# Altium footprint library Reflow3D1411sep.PcbLib: 657 footprints (part 29 of 42)
Each footprint in its own frame and in the unit in brackets; x right, y up, seen from the top. Pads: shape width x height; smd on the part's side, far side on the other; paste and mask are expansions set on the pad; w line width, h text height; cw(c..) or ccw(c..) is an arc to the next point about the centre after c.
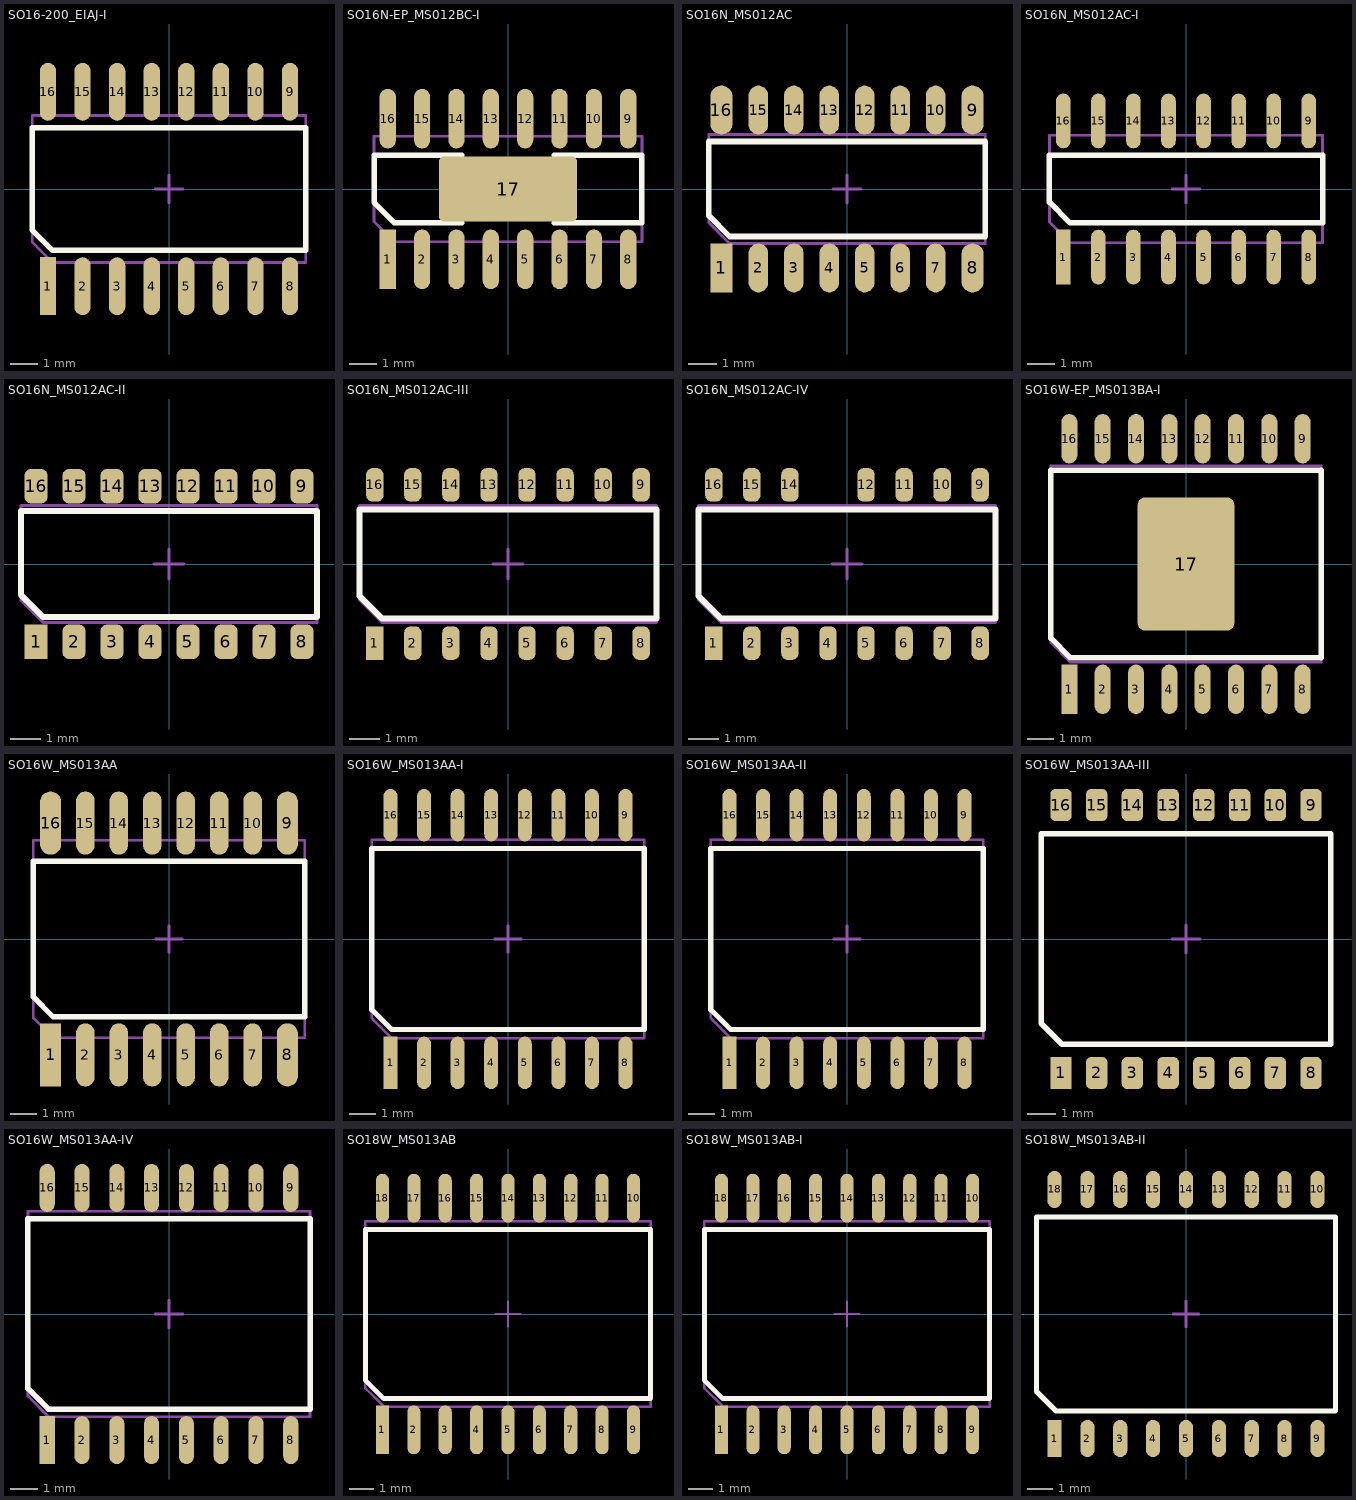
[diagram p28: the footprints below, top view; thin cyan lines are the x and y axes]

## SO16-200_EIAJ-I [mm] "www.fairchildsemi.com, M16D.pdf; www.intersil.com, M16.2-S.pdf"
height 1.85
pads (16):
  rect 0.6x2.13 smd mask+0.075: 1(-4.445,-3.57)
  oval 0.6x2.13 smd mask+0.075: 2(-3.175,-3.57) 3(-1.905,-3.57) 4(-0.635,-3.57) 5(0.635,-3.57) 6(1.905,-3.57) 7(3.175,-3.57) 8(4.445,-3.57) 9(4.445,3.57) 10(3.175,3.57) 11(1.905,3.57) 12(0.635,3.57) 13(-0.635,3.57) 14(-1.905,3.57) 15(-3.175,3.57) 16(-4.445,3.57)
Top Overlay:
  lines w0.2: -5.025,-1.5 -5.025,2.25 5.025,2.25 5.025,-2.25 -4.275,-2.25 -5.025,-1.5
Mechanical 13:
  lines w0.1: -5.025,-1.95 -5.025,2.7 5.025,2.7 5.025,-2.7 -4.275,-2.7 -5.025,-1.95
Mechanical 15:
  lines w0.1: -0.5,0 0.5,0 ; 0,-0.5 0,0.5
3D body: height 2, standoff 0, extent -5.15,-2.8 5.15,2.8

## SO16N-EP_MS012BC-I [mm] "www.semtech.com, sc4624.pdf"
height 1.55
pads (17):
  rect 0.6x2.2 smd mask+0.075: 1(-4.445,-2.6)
  oval 0.6x2.2 smd mask+0.075: 2(-3.175,-2.6) 4(-0.635,-2.6) 5(0.635,-2.6) 6(1.905,-2.6) 7(3.175,-2.6) 8(4.445,-2.6) 9(4.445,2.6) 10(3.175,2.6) 11(1.905,2.6) 12(0.635,2.6) 13(-0.635,2.6) 15(-3.175,2.6) 16(-4.445,2.6)
  oval 0.6x2.2 smd paste+0 mask+0.075: 3(-1.905,-2.6) 14(-1.905,2.6)
  rrect15% 5.1x2.4 smd paste-25.4 mask-25.4: 17(0,0)
Top Overlay:
  lines w0.2: -1.7,-1.25 -4.2,-1.25 -4.95,-0.5 -4.95,1.25 -1.7,1.25 ; 1.7,-1.25 4.95,-1.25 4.95,1.25 1.7,1.25
Top Paste:
  region: -1.4,1.15 1.4,1.15 1.4,-1.15 -1.4,-1.15
Top Solder:
  region: -1.45,1.275 -1.45,-1.275 1.45,-1.275 1.45,1.275
Mechanical 13:
  lines w0.1: -1.335,-0.58 -1.335,-1.08 -0.835,-1.08 ; -1.335,0.58 -1.335,1.08 -0.835,1.08 ; 0.835,-1.08 1.335,-1.08 1.335,-0.58 ; 0.835,1.08 1.335,1.08 1.335,0.58 ; -4.95,-1.2 -4.95,1.95 4.95,1.95 4.95,-1.95 -4.2,-1.95 -4.95,-1.2
Mechanical 15:
  lines w0.1: -0.5,0 0.5,0 ; 0,-0.5 0,0.5
3D body: height 1.75, standoff 0, extent -5,-2 5,2

## SO16N_MS012AC [mm] "www.nxp.com, SOT109-1.pdf, SOT109-1_fp_reflow.pdf"
height 1.55
pads (16):
  rect 0.8x1.75 smd mask+0.075: 1(-4.495,-2.825)
  oval 0.7x1.75 smd mask+0.075: 2(-3.175,-2.825) 3(-1.905,-2.825) 4(-0.635,-2.825) 5(0.635,-2.825) 6(1.905,-2.825) 7(3.175,-2.825) 10(3.175,2.825) 11(1.905,2.825) 12(0.635,2.825) 13(-0.635,2.825) 14(-1.905,2.825) 15(-3.175,2.825)
  oval 0.8x1.75 smd mask+0.075: 8(4.495,-2.825) 9(4.495,2.825) 16(-4.495,2.825)
Top Overlay:
  lines w0.2: -4.95,-0.95 -4.95,1.7 4.95,1.7 4.95,-1.7 -4.2,-1.7 -4.95,-0.95
Mechanical 13:
  lines w0.1: -4.95,-1.2 -4.2,-1.95 4.95,-1.95 4.95,1.95 -4.95,1.95 -4.95,-1.2
Mechanical 15:
  lines w0.1: -0.5,0 0.5,0 ; 0,-0.5 0,0.5
3D body: height 1.75, standoff 0, extent -5,-2 5,2

## SO16N_MS012AC-I [mm] "www.maxim-ic.com, 21-0041.PDF, 90-0097.PDF; www.jedec.org, MS-012F.pdf"
height 1.55
pads (16):
  rect 0.53x1.98 smd mask+0.075: 1(-4.445,-2.465)
  oval 0.53x1.98 smd mask+0.075: 2(-3.175,-2.465) 4(-0.635,-2.465) 5(0.635,-2.465) 6(1.905,-2.465) 7(3.175,-2.465) 8(4.445,-2.465) 9(4.445,2.465) 10(3.175,2.465) 11(1.905,2.465) 12(0.635,2.465) 13(-0.635,2.465) 15(-3.175,2.465) 16(-4.445,2.465)
  oval 0.53x1.98 smd paste+0 mask+0.075: 3(-1.905,-2.465) 14(-1.905,2.465)
Top Overlay:
  lines w0.2: -4.95,-0.475 -4.95,1.225 4.95,1.225 4.95,-1.225 -4.2,-1.225 -4.95,-0.475
Mechanical 13:
  lines w0.1: -4.95,-1.2 -4.95,1.95 4.95,1.95 4.95,-1.95 -4.2,-1.95 -4.95,-1.2
Mechanical 15:
  lines w0.1: -0.5,0 0.5,0 ; 0,-0.5 0,0.5
3D body: height 1.75, standoff 0, extent -5,-2 5,2

## SO16N_MS012AC-II [mm] "www.linear.com, SO_16_05-08-1610.pdf"
height 1.55
pads (16):
  rect 0.76x1.14 smd mask+0.075: 1(-4.445,-2.6)
  rrect50% 0.76x1.14 smd mask+0.075: 2(-3.175,-2.6) 4(-0.635,-2.6) 5(0.635,-2.6) 6(1.905,-2.6) 7(3.175,-2.6) 8(4.445,-2.6) 9(4.445,2.6) 10(3.175,2.6) 11(1.905,2.6) 13(-0.635,2.6) 14(-1.905,2.6) 15(-3.175,2.6) 16(-4.445,2.6)
  rrect50% 0.76x1.14 smd paste+0 mask+0.075: 3(-1.905,-2.6) 12(0.635,2.6)
Top Overlay:
  lines w0.2: -4.955,-1.025 -4.955,1.775 4.955,1.775 4.955,-1.775 -4.205,-1.775 -4.955,-1.025
Mechanical 13:
  lines w0.1: -4.955,-1.2 -4.205,-1.95 4.955,-1.95 4.955,1.95 -4.955,1.95 -4.955,-1.2
Mechanical 15:
  lines w0.1: -0.5,0 0.5,0 ; 0,-0.5 0,0.5
3D body: height 1.75, standoff 0, extent -5.005,-1.995 5.005,1.995

## SO16N_MS012AC-III [mm] "www.onsemi.com, 751B-05.PDF"
height 1.55
pads (16):
  rect 0.58x1.12 smd mask+0.075: 1(-4.445,-2.64)
  rrect75% 0.58x1.12 smd mask+0.075: 2(-3.175,-2.64) 4(-0.635,-2.64) 5(0.635,-2.64) 6(1.905,-2.64) 7(3.175,-2.64) 8(4.445,-2.64) 9(4.445,2.64) 10(3.175,2.64) 11(1.905,2.64) 12(0.635,2.64) 13(-0.635,2.64) 15(-3.175,2.64) 16(-4.445,2.64)
  rrect75% 0.58x1.12 smd paste+0 mask+0.075: 3(-1.905,-2.64) 14(-1.905,2.64)
Top Overlay:
  lines w0.2: -4.95,-1.075 -4.2,-1.825 4.95,-1.825 4.95,1.825 -4.95,1.825 -4.95,-1.075
Mechanical 13:
  lines w0.1: -4.95,-1.2 -4.2,-1.95 4.95,-1.95 4.95,1.95 -4.95,1.95 -4.95,-1.2
Mechanical 15:
  lines w0.1: -0.5,0 0.5,0 ; 0,-0.5 0,0.5
3D body: height 1.75, standoff 0, extent -5,-2 5,2

## SO16N_MS012AC-IV [mm] "www.onsemi.com, 751AM.PDF"
height 1.55
pads (15):
  rect 0.58x1.12 smd mask+0.075: 1(-4.445,-2.64)
  rrect75% 0.58x1.12 smd mask+0.075: 2(-3.175,-2.64) 4(-0.635,-2.64) 5(0.635,-2.64) 6(1.905,-2.64) 7(3.175,-2.64) 8(4.445,-2.64) 9(4.445,2.64) 10(3.175,2.64) 11(1.905,2.64) 12(0.635,2.64) 15(-3.175,2.64) 16(-4.445,2.64)
  rrect75% 0.58x1.12 smd paste+0 mask+0.075: 3(-1.905,-2.64) 14(-1.905,2.64)
Top Overlay:
  lines w0.2: -4.95,-1.075 -4.95,1.825 4.95,1.825 4.95,-1.825 -4.2,-1.825 -4.95,-1.075
Mechanical 13:
  lines w0.1: -4.95,-1.2 -4.95,1.95 4.95,1.95 4.95,-1.95 -4.2,-1.95 -4.95,-1.2
Mechanical 15:
  lines w0.1: -0.5,0 0.5,0 ; 0,-0.5 0,0.5
3D body: height 1.75, standoff 0, extent -5,-2 5,2

## SO16W-EP_MS013BA-I [mm] "www.onsemi.com, 751AG.PDF"
height 2.5
pads (17):
  rect 0.61x1.88 smd mask+0.075: 1(-4.445,-4.775)
  oval 0.61x1.88 smd mask+0.075: 2(-3.175,-4.775) 3(-1.905,-4.775) 4(-0.635,-4.775) 5(0.635,-4.775) 6(1.905,-4.775) 7(3.175,-4.775) 8(4.445,-4.775) 9(4.445,4.775) 10(3.175,4.775) 11(1.905,4.775) 12(0.635,4.775) 13(-0.635,4.775) 14(-1.905,4.775) 15(-3.175,4.775) 16(-4.445,4.775)
  rrect15% 3.68x5.08 smd mask+0.075: 17(0,0)
Top Overlay:
  lines w0.2: -5.15,-2.825 -4.4,-3.575 5.15,-3.575 5.15,3.575 -5.15,3.575 -5.15,-2.825
Mechanical 13:
  lines w0.1: -1.705,-1.84 -1.705,-2.34 -1.205,-2.34 ; -1.705,1.84 -1.705,2.34 -1.205,2.34 ; 1.205,-2.34 1.705,-2.34 1.705,-1.84 ; 1.205,2.34 1.705,2.34 1.705,1.84 ; -5.15,-3 -4.4,-3.75 5.15,-3.75 5.15,3.75 -5.15,3.75 -5.15,-3
Mechanical 15:
  lines w0.1: -0.5,0 0.5,0 ; 0,-0.5 0,0.5
3D body: height 2.65, standoff 0, extent -5.225,-3.8 5.225,3.8

## SO16W_MS013AA [mm] "www.nxp.com, sot162-1_po.pdf, SOT162-1_fp_reflow.pdf"
height 2.5
pads (16):
  rect 0.8x2.4 smd mask+0.075: 1(-4.495,-4.4)
  oval 0.7x2.4 smd mask+0.075: 2(-3.175,-4.4) 3(-1.905,-4.4) 4(-0.635,-4.4) 5(0.635,-4.4) 6(1.905,-4.4) 7(3.175,-4.4) 10(3.175,4.4) 11(1.905,4.4) 12(0.635,4.4) 13(-0.635,4.4) 14(-1.905,4.4) 15(-3.175,4.4)
  oval 0.8x2.4 smd mask+0.075: 8(4.495,-4.4) 9(4.495,4.4) 16(-4.495,4.4)
Top Overlay:
  lines w0.2: -5.15,-2.2 -4.4,-2.95 5.15,-2.95 5.15,2.95 -5.15,2.95 -5.15,-2.2
Mechanical 13:
  lines w0.1: -5.15,-3 -4.4,-3.75 5.15,-3.75 5.15,3.75 -5.15,3.75 -5.15,-3
Mechanical 15:
  lines w0.1: -0.5,0 0.5,0 ; 0,-0.5 0,0.5
3D body: height 2.65, standoff 0, extent -5.25,-3.8 5.25,3.8

## SO16W_MS013AA-I [mm] "www.allegromicro.com, pkgso1.pdf; www.maxim-ic.com, 90-0107.PDF; www.jedec.org, MS-013E.pdf"
height 2.4
pads (16):
  rect 0.53x1.98 smd mask+0.075: 1(-4.445,-4.685)
  oval 0.53x1.98 smd mask+0.075: 2(-3.175,-4.685) 3(-1.905,-4.685) 4(-0.635,-4.685) 5(0.635,-4.685) 6(1.905,-4.685) 7(3.175,-4.685) 8(4.445,-4.685) 9(4.445,4.685) 10(3.175,4.685) 11(1.905,4.685) 12(0.635,4.685) 13(-0.635,4.685) 14(-1.905,4.685) 15(-3.175,4.685) 16(-4.445,4.685)
Top Overlay:
  lines w0.2: -5.15,-2.675 -4.4,-3.425 5.15,-3.425 5.15,3.425 -5.15,3.425 -5.15,-2.675
Mechanical 13:
  lines w0.1: -5.15,-3 -4.4,-3.75 5.15,-3.75 5.15,3.75 -5.15,3.75 -5.15,-3
Mechanical 15:
  lines w0.1: -0.5,0 0.5,0 ; 0,-0.5 0,0.5
3D body: height 2.65, standoff 0, extent -5.25,-3.8 5.25,3.8

## SO16W_MS013AA-II [mm] "www.maxim-ic.com, 21-0042.PDF, 90-0107.PDF"
height 2.5
pads (16):
  rect 0.53x1.98 smd mask+0.075: 1(-4.445,-4.685)
  oval 0.53x1.98 smd mask+0.075: 2(-3.175,-4.685) 3(-1.905,-4.685) 4(-0.635,-4.685) 5(0.635,-4.685) 6(1.905,-4.685) 7(3.175,-4.685) 8(4.445,-4.685) 9(4.445,4.685) 10(3.175,4.685) 11(1.905,4.685) 12(0.635,4.685) 13(-0.635,4.685) 14(-1.905,4.685) 15(-3.175,4.685) 16(-4.445,4.685)
Top Overlay:
  lines w0.2: -5.15,-2.675 -5.15,3.425 5.15,3.425 5.15,-3.425 -4.4,-3.425 -5.15,-2.675
Mechanical 13:
  lines w0.1: -5.15,-3 -5.15,3.75 5.15,3.75 5.15,-3.75 -4.4,-3.75 -5.15,-3
Mechanical 15:
  lines w0.1: -0.5,0 0.5,0 ; 0,-0.5 0,0.5
3D body: height 2.65, standoff 0, extent -5.25,-3.8 5.25,3.8

## SO16W_MS013AA-III [mm] "www.linear.com, SO_16_05-08-1620.pdf"
height 2.5
pads (16):
  rect 0.76x1.14 smd mask+0.075: 1(-4.445,-4.763)
  rrect50% 0.76x1.14 smd mask+0.075: 2(-3.175,-4.763) 3(-1.905,-4.763) 4(-0.635,-4.763) 5(0.635,-4.763) 6(1.905,-4.763) 7(3.175,-4.763) 8(4.445,-4.763) 9(4.445,4.763) 10(3.175,4.763) 11(1.905,4.763) 12(0.635,4.763) 13(-0.635,4.763) 14(-1.905,4.763) 15(-3.175,4.763) 16(-4.445,4.763)
Top Overlay:
  lines w0.2: -5.15,-2.995 -4.4,-3.745 5.15,-3.745 5.15,3.745 -5.15,3.745 -5.15,-2.995
Mechanical 13:
  lines w0.1: -5.15,-2.995 -5.15,3.745 5.15,3.745 5.15,-3.745 -4.4,-3.745 -5.15,-2.995
Mechanical 15:
  lines w0.1: -0.5,0 0.5,0 ; 0,-0.5 0,0.5
3D body: height 2.64, standoff 0, extent -5.245,-3.8 5.245,3.8

## SO16W_MS013AA-IV [mm] "www.fairchildsemi.com, M16B.pdf"
height 2.4
pads (16):
  rect 0.55x1.75 smd mask+0.075: 1(-4.445,-4.6)
  oval 0.55x1.75 smd mask+0.075: 2(-3.175,-4.6) 3(-1.905,-4.6) 4(-0.635,-4.6) 5(0.635,-4.6) 6(1.905,-4.6) 7(3.175,-4.6) 8(4.445,-4.6) 9(4.445,4.6) 10(3.175,4.6) 11(1.905,4.6) 12(0.635,4.6) 13(-0.635,4.6) 14(-1.905,4.6) 15(-3.175,4.6) 16(-4.445,4.6)
Top Overlay:
  lines w0.2: -5.15,-2.725 -4.4,-3.475 5.15,-3.475 5.15,3.475 -5.15,3.475 -5.15,-2.725
Mechanical 13:
  lines w0.1: -5.15,-3 -5.15,3.75 5.15,3.75 5.15,-3.75 -4.4,-3.75 -5.15,-3
Mechanical 15:
  lines w0.1: -0.5,0 0.5,0 ; 0,-0.5 0,0.5
3D body: height 2.65, standoff 0, extent -5.25,-3.8 5.25,3.8

## SO18W_MS013AB [mm] "www.maxim-ic.com, 21-0042.PDF, 90-0181.PDF"
height 2.5
pads (18):
  rect 0.53x1.98 smd mask+0.075: 1(-5.08,-4.685)
  oval 0.53x1.98 smd mask+0.075: 2(-3.81,-4.685) 3(-2.54,-4.685) 4(-1.27,-4.685) 5(0,-4.685) 6(1.27,-4.685) 7(2.54,-4.685) 8(3.81,-4.685) 9(5.08,-4.685) 10(5.08,4.685) 11(3.81,4.685) 12(2.54,4.685) 13(1.27,4.685) 14(0,4.685) 15(-1.27,4.685) 16(-2.54,4.685) 17(-3.81,4.685) 18(-5.08,4.685)
Top Overlay:
  lines w0.2: -5.775,-2.675 -5.025,-3.425 5.775,-3.425 5.775,3.425 -5.775,3.425 -5.775,-2.675
Mechanical 13:
  lines w0.1: -5.775,-3 -5.775,3.75 5.775,3.75 5.775,-3.75 -5.025,-3.75 -5.775,-3
Mechanical 15:
  lines w0.1: -0.5,0 0.5,0 ; 0,-0.5 0,0.5
3D body: height 2.65, standoff 0, extent -5.875,-3.8 5.875,3.8

## SO18W_MS013AB-I [mm] "www.allegromicro.com, pkgso1.pdf; www.maxim-ic.com, 90-0181.PDF; www.jedec.org, MS-013E.pdf"
height 2.4
pads (18):
  rect 0.53x1.98 smd mask+0.075: 1(-5.08,-4.685)
  oval 0.53x1.98 smd mask+0.075: 2(-3.81,-4.685) 3(-2.54,-4.685) 4(-1.27,-4.685) 5(0,-4.685) 6(1.27,-4.685) 7(2.54,-4.685) 8(3.81,-4.685) 9(5.08,-4.685) 10(5.08,4.685) 11(3.81,4.685) 12(2.54,4.685) 13(1.27,4.685) 14(0,4.685) 15(-1.27,4.685) 16(-2.54,4.685) 17(-3.81,4.685) 18(-5.08,4.685)
Top Overlay:
  lines w0.2: -5.775,-2.675 -5.775,3.425 5.775,3.425 5.775,-3.425 -5.025,-3.425 -5.775,-2.675
Mechanical 13:
  lines w0.1: -5.775,-3 -5.025,-3.75 5.775,-3.75 5.775,3.75 -5.775,3.75 -5.775,-3
Mechanical 15:
  lines w0.1: -0.5,0 0.5,0 ; 0,-0.5 0,0.5
3D body: height 2.65, standoff 0, extent -5.875,-3.8 5.875,3.8

## SO18W_MS013AB-II [mm] "www.analog.com, 33254132129439RW_18.pdf, 269270148rw_18.pdf"
height 2.5
pads (18):
  rect 0.55x1.43 smd mask+0.075: 1(-5.08,-4.81)
  oval 0.55x1.43 smd mask+0.075: 2(-3.81,-4.81) 3(-2.54,-4.81) 4(-1.27,-4.81) 5(0,-4.81) 6(1.27,-4.81) 7(2.54,-4.81) 8(3.81,-4.81) 9(5.08,-4.81) 10(5.08,4.81) 11(3.81,4.81) 12(2.54,4.81) 13(1.27,4.81) 14(0,4.81) 15(-1.27,4.81) 16(-2.54,4.81) 17(-3.81,4.81) 18(-5.08,4.81)
Top Overlay:
  lines w0.2: -5.775,-3 -5.775,3.75 5.775,3.75 5.775,-3.75 -5.025,-3.75 -5.775,-3
Mechanical 13:
  lines w0.1: -5.775,-3 -5.025,-3.75 5.775,-3.75 5.775,3.75 -5.775,3.75 -5.775,-3
Mechanical 15:
  lines w0.1: -0.5,0 0.5,0 ; 0,-0.5 0,0.5
3D body: height 2.65, standoff 0, extent -5.875,-3.8 5.875,3.8